# Altium footprint library MyPcb.PcbLib: 367 footprints (part 19 of 23)
Each footprint in its own frame and in the unit in brackets; x right, y up, seen from the top. Pads: shape width x height; smd on the part's side, far side on the other; paste and mask are expansions set on the pad; w line width, h text height; cw(c..) or ccw(c..) is an arc to the next point about the centre after c.
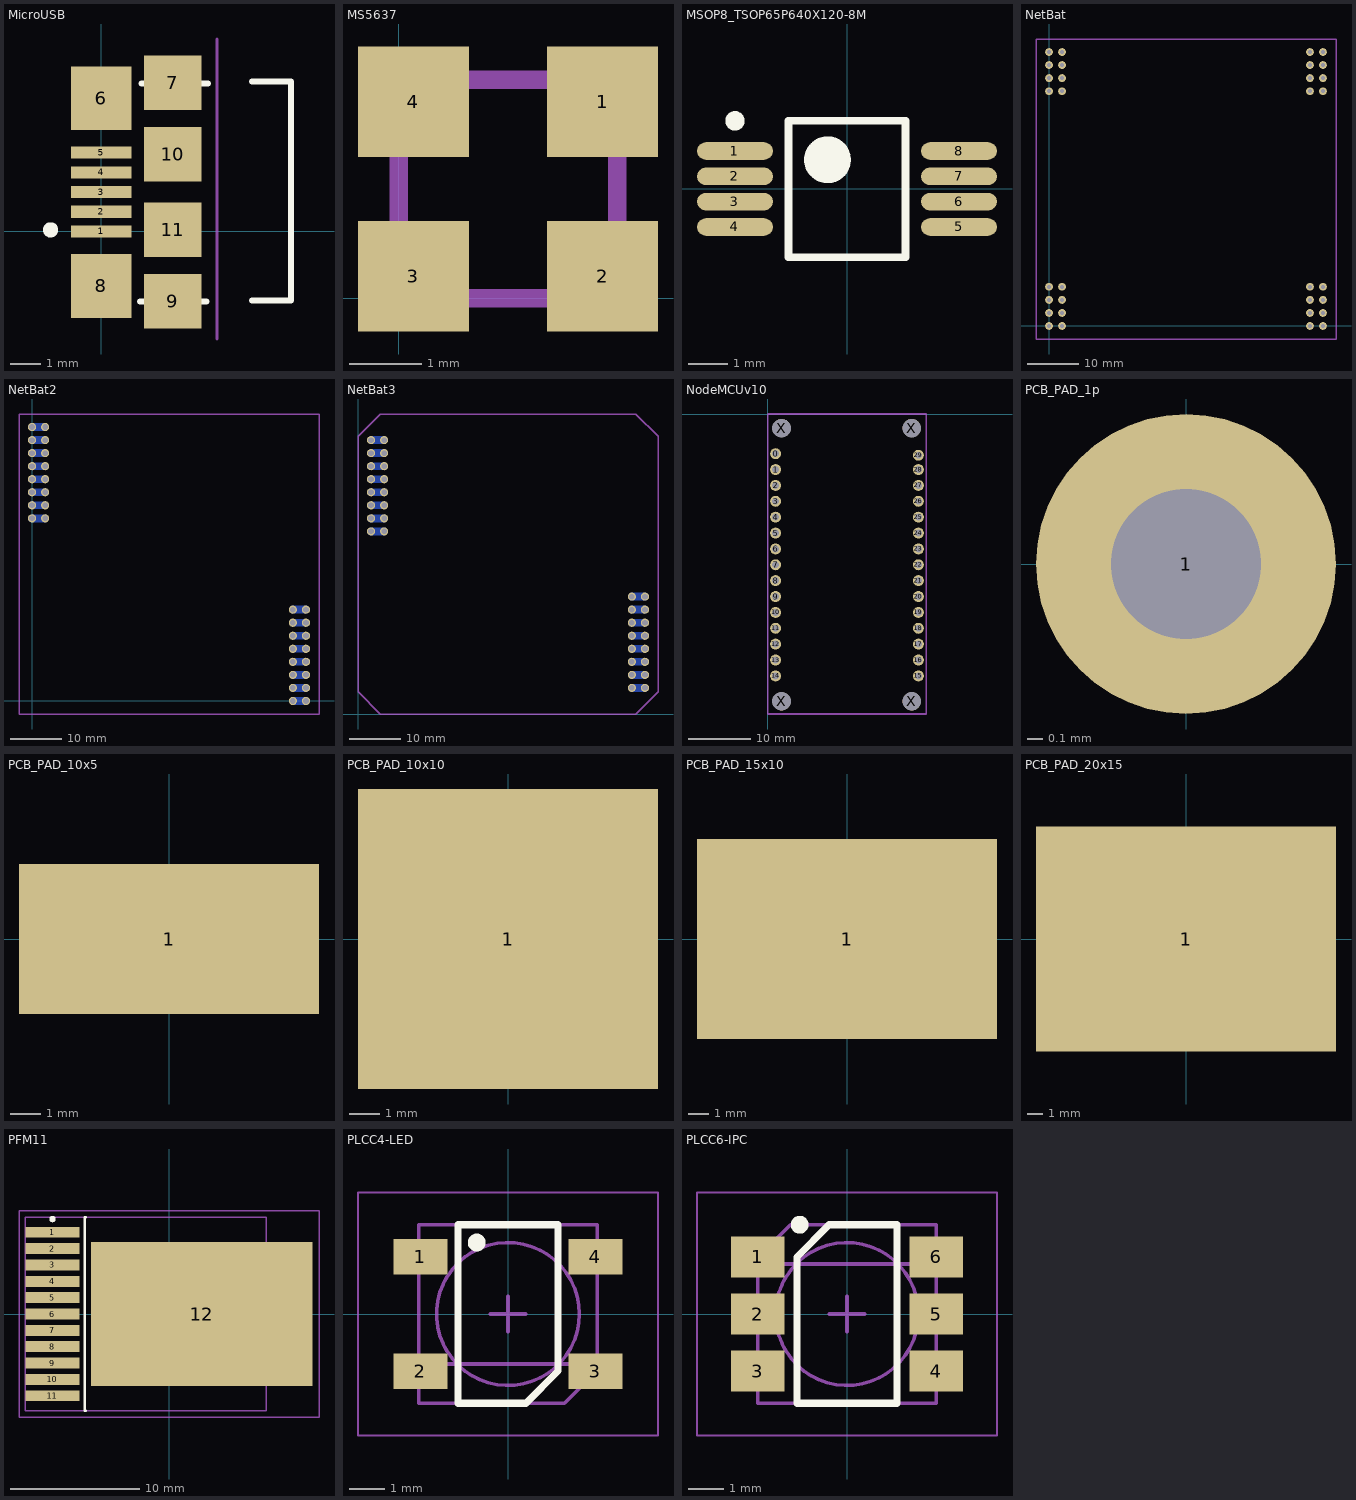
[diagram p18: the footprints below, top view; thin cyan lines are the x and y axes]

## MicroUSB [mm] "10118192-0001LF"
pads (11):
  rect 2x0.4 smd: 1(0,0) 2(0,0.65) 3(0,1.3) 4(0,1.95) 5(0,2.6)
  rect 2x2.1 smd: 6(0,4.4) 8(0,-1.8)
  rect 1.9x1.8 smd: 7(2.35,4.9) 9(2.35,-2.3) 10(2.35,2.55) 11(2.35,0.05)
Top Overlay:
  circle w0.25: c-1.676,0.051 r0.125
  lines w0.2: -0.584,-2.273 -0.584,-0.94 ; -0.584,3.696 -0.584,5.029 ; 1.27,-2.311 3.47,-2.311 ; 1.321,4.877 3.521,4.877 ; 4.963,-2.286 6.263,-2.286 6.263,4.953 4.963,4.953
Mechanical 1:
  lines w0.1: 3.81,-3.55 3.81,6.35
  text "PCB Edge" at 4.318,-2.464 h0.25

## MS5637 [mm]
pads (4):
  rect 1.524x1.524 smd: 1(2.8,2.7) 2(2.8,0.3) 3(0.2,0.3) 4(0.2,2.7)
Mechanical 1:
  lines w0.254: 0,0 3,0 3,3 0,3 0,0

## MSOP8_TSOP65P640X120-8M [mm] "TSOP, 8-Leads, Body 3,25x3,20mm, Pitch 0,65mm, IPC Low Density"
height 1.2
pads (8):
  oval 1.95x0.45 smd: 1(-2.875,0.975) 2(-2.875,0.325) 3(-2.875,-0.325) 4(-2.875,-0.975) 5(2.875,-0.975) 6(2.875,-0.325) 7(2.875,0.325) 8(2.875,0.975)
Top Overlay:
  circle w0.6: c-0.5,0.75 r0.3
  circle w0.25: c-2.875,1.75 r0.125
  lines w0.2: -1.5,-1.75 1.5,-1.75 1.5,1.75 -1.5,1.75 -1.5,-1.75

## NetBat [mil]
pads (32):
  round 60 hole 30: 3V(2100,300) 3V(2100,1800) 5V(2000,300) 5V(2000,1800) ESP_RX(0,200) ESP_RX(0,1900) ESP_TX(100,200) ESP_TX(100,1900) GND(2100,0) GND(2100,2100) MISO(2000,100) MISO(2000,2000) MOSI(2100,100) MOSI(2100,2000) NETSTATUS(100,100) NETSTATUS(100,2000) SCK(2000,200) SCK(2000,1900) SCL(100,300) SCL(100,1800) SDA(0,300) SDA(0,1800) SIM_KEY(0,0) SIM_KEY(0,2100) SS(2100,200) SS(2100,1900) STATUS(0,100) STATUS(0,2000) SZENZORLED(100,0) SZENZORLED(100,2100) UART_EN(2000,0) UART_EN(2000,2100)
Mechanical 1:
  lines w10: -100,-100 -100,2200 2200,2200 2200,-100 -100,-100
3D body: height 100, standoff 0, extent 2060,-50 2140,50
3D body: height 100, standoff 0, extent 2060,50 2140,150
3D body: height 100, standoff 0, extent 2060,150 2140,250
3D body: height 100, standoff 0, extent 2060,250 2140,350
3D body: height 100, standoff 0, extent 1960,-50 2040,50
3D body: height 100, standoff 0, extent 1960,50 2040,150
3D body: height 100, standoff 0, extent 1960,150 2040,250
3D body: height 100, standoff 0, extent 1960,250 2040,350
3D body: height 100, standoff 0, extent 2060,1750 2140,1850
3D body: height 100, standoff 0, extent 2060,1850 2140,1950
3D body: height 100, standoff 0, extent 2060,1950 2140,2050
3D body: height 100, standoff 0, extent 2060,2050 2140,2150
3D body: height 100, standoff 0, extent 1960,1750 2040,1850
3D body: height 100, standoff 0, extent 1960,1850 2040,1950
3D body: height 100, standoff 0, extent 1960,1950 2040,2050
3D body: height 100, standoff 0, extent 1960,2050 2040,2150
3D body: height 100, standoff 0, extent 60,1750 140,1850
3D body: height 100, standoff 0, extent 60,1850 140,1950
3D body: height 100, standoff 0, extent 60,1950 140,2050
3D body: height 100, standoff 0, extent 60,2050 140,2150
3D body: height 100, standoff 0, extent -40,1750 40,1850
3D body: height 100, standoff 0, extent -40,1850 40,1950
3D body: height 100, standoff 0, extent -40,1950 40,2050
3D body: height 100, standoff 0, extent -40,2050 40,2150
3D body: height 100, standoff 0, extent 60,250 140,350
3D body: height 100, standoff 0, extent 60,150 140,250
3D body: height 100, standoff 0, extent 60,50 140,150
3D body: height 100, standoff 0, extent 60,-50 140,50
3D body: height 100, standoff 0, extent -40,250 40,350
3D body: height 100, standoff 0, extent -40,150 40,250
3D body: height 100, standoff 0, extent -40,50 40,150
3D body: height 0, standoff -118.11, extent 90,-10 110,10
3D body: height 336.22, standoff 100, extent 90,-10 110,10
3D body: height 100, standoff 0, extent -40,-50 40,50
3D body: height 336.22, standoff 100, extent 90,90 110,110
3D body: height 0, standoff -118.11, extent 90,90 110,110
3D body: height 336.22, standoff 100, extent -10,90 10,110
3D body: height 0, standoff -118.11, extent -10,90 10,110
3D body: height 336.22, standoff 100, extent 90,190 110,210
3D body: height 0, standoff -118.11, extent 90,190 110,210
3D body: height 336.22, standoff 100, extent -10,190 10,210
3D body: height 0, standoff -118.11, extent -10,190 10,210
3D body: height 336.22, standoff 100, extent -10,290 10,310
3D body: height 0, standoff -118.11, extent -10,290 10,310
3D body: height 336.22, standoff 100, extent 90,290 110,310
3D body: height 0, standoff -118.11, extent 90,290 110,310
3D body: height 336.22, standoff 100, extent -10,1790 10,1810
3D body: height 0, standoff -118.11, extent -10,1790 10,1810
3D body: height 336.22, standoff 100, extent 90,1790 110,1810
3D body: height 0, standoff -118.11, extent 90,1790 110,1810
3D body: height 336.22, standoff 100, extent 90,1890 110,1910
3D body: height 0, standoff -118.11, extent 90,1890 110,1910
3D body: height 336.22, standoff 100, extent -10,1890 10,1910
3D body: height 0, standoff -118.11, extent -10,1890 10,1910
3D body: height 336.22, standoff 100, extent 90,1990 110,2010
3D body: height 0, standoff -118.11, extent 90,1990 110,2010
3D body: height 336.22, standoff 100, extent -10,1990 10,2010
3D body: height 0, standoff -118.11, extent -10,1990 10,2010
3D body: height 336.22, standoff 100, extent 90,2090 110,2110
3D body: height 0, standoff -118.11, extent 90,2090 110,2110
3D body: height 336.22, standoff 100, extent -10,2090 10,2110
3D body: height 0, standoff -118.11, extent -10,2090 10,2110
3D body: height 336.22, standoff 100, extent 1990,2090 2010,2110
3D body: height 0, standoff -118.11, extent 1990,2090 2010,2110
3D body: height 336.22, standoff 100, extent 2090,2090 2110,2110
3D body: height 0, standoff -118.11, extent 2090,2090 2110,2110
3D body: height 336.22, standoff 100, extent 2090,1990 2110,2010
3D body: height 0, standoff -118.11, extent 2090,1990 2110,2010
3D body: height 336.22, standoff 100, extent 1990,1990 2010,2010
3D body: height 0, standoff -118.11, extent 1990,1990 2010,2010
3D body: height 336.22, standoff 100, extent 2090,1890 2110,1910
3D body: height 0, standoff -118.11, extent 2090,1890 2110,1910
3D body: height 336.22, standoff 100, extent 1990,1890 2010,1910
3D body: height 0, standoff -118.11, extent 1990,1890 2010,1910
3D body: height 336.22, standoff 100, extent 2090,1790 2110,1810
3D body: height 0, standoff -118.11, extent 2090,1790 2110,1810
3D body: height 336.22, standoff 100, extent 1990,1790 2010,1810
3D body: height 0, standoff -118.11, extent 1990,1790 2010,1810
3D body: height 336.22, standoff 100, extent 1990,290 2010,310
3D body: height 0, standoff -118.11, extent 1990,290 2010,310
3D body: height 336.22, standoff 100, extent 2090,290 2110,310
3D body: height 0, standoff -118.11, extent 2090,290 2110,310
3D body: height 336.22, standoff 100, extent 1990,190 2010,210
3D body: height 0, standoff -118.11, extent 1990,190 2010,210
3D body: height 336.22, standoff 100, extent 2090,190 2110,210
3D body: height 0, standoff -118.11, extent 2090,190 2110,210
3D body: height 336.22, standoff 100, extent 2090,90 2110,110
3D body: height 0, standoff -118.11, extent 2090,90 2110,110
3D body: height 336.22, standoff 100, extent 1990,90 2010,110
3D body: height 0, standoff -118.11, extent 1990,90 2010,110
3D body: height 336.22, standoff 100, extent 1990,-10 2010,10
3D body: height 0, standoff -118.11, extent 1990,-10 2010,10
3D body: height 336.22, standoff 100, extent 2090,-10 2110,10
3D body: height 0, standoff -118.11, extent 2090,-10 2110,10
3D body: height 336.22, standoff 100, extent -10,-10 10,10
3D body: height 0, standoff -118.11, extent -10,-10 10,10

## NetBat2 [mm]
pads (32):
  round 1.6 hole 1.1: 3V(50.8,5.08) 3V(53.34,5.08) 5V(50.8,2.54) 5V(53.34,2.54) ESP_RX(50.8,15.24) ESP_RX(53.34,15.24) ESP_TX(50.8,17.78) ESP_TX(53.34,17.78) GND(50.8,0) GND(53.34,0) MISO(0,48.26) MISO(2.54,48.26) MOSI(0,45.72) MOSI(2.54,45.72) NETSTATUS(0,40.64) NETSTATUS(2.54,40.64) SCK(0,50.8) SCK(2.54,50.8) SCL(50.8,12.7) SCL(53.34,12.7) SDA(50.8,10.16) SDA(53.34,10.16) SIM_KEY(0,38.1) SIM_KEY(2.54,38.1) SS(0,53.34) SS(2.54,53.34) STATUS(0,43.18) STATUS(2.54,43.18) SZENZORLED(0,35.56) SZENZORLED(2.54,35.56) UART_EN(50.8,7.62) UART_EN(53.34,7.62)
Bottom Layer:
  lines w1.524: 0,35.56 2.54,35.56 ; 0,38.1 2.54,38.1 ; 0,40.64 2.54,40.64 ; 0,43.18 2.54,43.18 ; 0,45.72 2.54,45.72 ; 0,48.26 2.54,48.26 ; 0,50.8 2.54,50.8 ; 0,53.34 2.54,53.34 ; 50.8,0 53.34,0 ; 50.8,2.54 53.34,2.54 ; 50.8,5.08 53.34,5.08 ; 50.8,7.62 53.34,7.62 ; 50.8,10.16 53.34,10.16 ; 50.8,12.7 53.34,12.7 ; 50.8,15.24 53.34,15.24 ; 50.8,17.78 53.34,17.78
Mechanical 1:
  lines w0.254: -2.54,-2.54 -2.54,55.88 55.88,55.88 55.88,-2.54 -2.54,-2.54
3D body: height 2.54, standoff 0, extent 52.324,-1.27 54.356,1.27
3D body: height 2.54, standoff 0, extent 52.324,1.27 54.356,3.81
3D body: height 2.54, standoff 0, extent 52.324,3.81 54.356,6.35
3D body: height 2.54, standoff 0, extent 52.324,6.35 54.356,8.89
3D body: height 2.54, standoff 0, extent 49.784,-1.27 51.816,1.27
3D body: height 2.54, standoff 0, extent 49.784,1.27 51.816,3.81
3D body: height 2.54, standoff 0, extent 49.784,3.81 51.816,6.35
3D body: height 2.54, standoff 0, extent 49.784,6.35 51.816,8.89
3D body: height 8.54, standoff 2.54, extent 50.546,7.366 51.054,7.874
3D body: height 0, standoff -3, extent 50.546,7.366 51.054,7.874
3D body: height 8.54, standoff 2.54, extent 53.086,7.366 53.594,7.874
3D body: height 0, standoff -3, extent 53.086,7.366 53.594,7.874
3D body: height 8.54, standoff 2.54, extent 50.546,4.826 51.054,5.334
3D body: height 0, standoff -3, extent 50.546,4.826 51.054,5.334
3D body: height 8.54, standoff 2.54, extent 53.086,4.826 53.594,5.334
3D body: height 0, standoff -3, extent 53.086,4.826 53.594,5.334
3D body: height 8.54, standoff 2.54, extent 53.086,2.286 53.594,2.794
3D body: height 0, standoff -3, extent 53.086,2.286 53.594,2.794
3D body: height 8.54, standoff 2.54, extent 50.546,2.286 51.054,2.794
3D body: height 0, standoff -3, extent 50.546,2.286 51.054,2.794
3D body: height 8.54, standoff 2.54, extent 50.546,-0.254 51.054,0.254
3D body: height 0, standoff -3, extent 50.546,-0.254 51.054,0.254
3D body: height 8.54, standoff 2.54, extent 53.086,-0.254 53.594,0.254
3D body: height 0, standoff -3, extent 53.086,-0.254 53.594,0.254
3D body: height 0, standoff -3, extent 53.086,9.906 53.594,10.414
3D body: height 8.54, standoff 2.54, extent 53.086,9.906 53.594,10.414
3D body: height 0, standoff -3, extent 53.086,12.446 53.594,12.954
3D body: height 8.54, standoff 2.54, extent 53.086,12.446 53.594,12.954
3D body: height 0, standoff -3, extent 53.086,14.986 53.594,15.494
3D body: height 8.54, standoff 2.54, extent 53.086,14.986 53.594,15.494
3D body: height 0, standoff -3, extent 53.086,17.526 53.594,18.034
3D body: height 8.54, standoff 2.54, extent 53.086,17.526 53.594,18.034
3D body: height 2.54, standoff 0, extent 52.324,16.51 54.356,19.05
3D body: height 2.54, standoff 0, extent 52.324,13.97 54.356,16.51
3D body: height 2.54, standoff 0, extent 52.324,11.43 54.356,13.97
3D body: height 2.54, standoff 0, extent 52.324,8.89 54.356,11.43
3D body: height 0, standoff -3, extent 50.546,9.906 51.054,10.414
3D body: height 8.54, standoff 2.54, extent 50.546,9.906 51.054,10.414
3D body: height 0, standoff -3, extent 50.546,12.446 51.054,12.954
3D body: height 8.54, standoff 2.54, extent 50.546,12.446 51.054,12.954
3D body: height 0, standoff -3, extent 50.546,14.986 51.054,15.494
3D body: height 8.54, standoff 2.54, extent 50.546,14.986 51.054,15.494
3D body: height 0, standoff -3, extent 50.546,17.526 51.054,18.034
3D body: height 8.54, standoff 2.54, extent 50.546,17.526 51.054,18.034
3D body: height 2.54, standoff 0, extent 49.784,16.51 51.816,19.05
3D body: height 2.54, standoff 0, extent 49.784,13.97 51.816,16.51
3D body: height 2.54, standoff 0, extent 49.784,11.43 51.816,13.97
3D body: height 2.54, standoff 0, extent 49.784,8.89 51.816,11.43
3D body: height 2.54, standoff 0, extent -1.016,44.45 1.016,46.99
3D body: height 2.54, standoff 0, extent -1.016,46.99 1.016,49.53
3D body: height 2.54, standoff 0, extent -1.016,49.53 1.016,52.07
3D body: height 2.54, standoff 0, extent -1.016,52.07 1.016,54.61
3D body: height 8.54, standoff 2.54, extent -0.254,45.466 0.254,45.974
3D body: height 0, standoff -3, extent -0.254,45.466 0.254,45.974
3D body: height 8.54, standoff 2.54, extent -0.254,48.006 0.254,48.514
3D body: height 0, standoff -3, extent -0.254,48.006 0.254,48.514
3D body: height 8.54, standoff 2.54, extent -0.254,50.546 0.254,51.054
3D body: height 0, standoff -3, extent -0.254,50.546 0.254,51.054
3D body: height 8.54, standoff 2.54, extent -0.254,53.086 0.254,53.594
3D body: height 0, standoff -3, extent -0.254,53.086 0.254,53.594
3D body: height 0, standoff -3, extent -0.254,42.926 0.254,43.434
3D body: height 8.54, standoff 2.54, extent -0.254,42.926 0.254,43.434
3D body: height 0, standoff -3, extent -0.254,40.386 0.254,40.894
3D body: height 8.54, standoff 2.54, extent -0.254,40.386 0.254,40.894
3D body: height 0, standoff -3, extent -0.254,37.846 0.254,38.354
3D body: height 8.54, standoff 2.54, extent -0.254,37.846 0.254,38.354
3D body: height 2.54, standoff 0, extent -1.016,36.83 1.016,39.37
3D body: height 2.54, standoff 0, extent -1.016,39.37 1.016,41.91
3D body: height 2.54, standoff 0, extent -1.016,41.91 1.016,44.45
3D body: height 2.54, standoff 0, extent 1.524,44.45 3.556,46.99
3D body: height 2.54, standoff 0, extent 1.524,46.99 3.556,49.53
3D body: height 2.54, standoff 0, extent 1.524,49.53 3.556,52.07
3D body: height 2.54, standoff 0, extent 1.524,52.07 3.556,54.61
3D body: height 8.54, standoff 2.54, extent 2.286,45.466 2.794,45.974
3D body: height 0, standoff -3, extent 2.286,45.466 2.794,45.974
3D body: height 8.54, standoff 2.54, extent 2.286,48.006 2.794,48.514
3D body: height 0, standoff -3, extent 2.286,48.006 2.794,48.514
3D body: height 8.54, standoff 2.54, extent 2.286,50.546 2.794,51.054
3D body: height 0, standoff -3, extent 2.286,50.546 2.794,51.054
3D body: height 8.54, standoff 2.54, extent 2.286,53.086 2.794,53.594
3D body: height 0, standoff -3, extent 2.286,53.086 2.794,53.594
3D body: height 0, standoff -3, extent 2.286,35.306 2.794,35.814
3D body: height 8.54, standoff 2.54, extent 2.286,35.306 2.794,35.814
3D body: height 0, standoff -3, extent 2.286,42.926 2.794,43.434
3D body: height 8.54, standoff 2.54, extent 2.286,42.926 2.794,43.434
3D body: height 0, standoff -3, extent 2.286,40.386 2.794,40.894
3D body: height 8.54, standoff 2.54, extent 2.286,40.386 2.794,40.894
3D body: height 0, standoff -3, extent 2.286,37.846 2.794,38.354
3D body: height 8.54, standoff 2.54, extent 2.286,37.846 2.794,38.354
3D body: height 2.54, standoff 0, extent 1.524,34.29 3.556,36.83
3D body: height 2.54, standoff 0, extent 1.524,36.83 3.556,39.37
3D body: height 2.54, standoff 0, extent 1.524,39.37 3.556,41.91
3D body: height 2.54, standoff 0, extent 1.524,41.91 3.556,44.45
3D body: height 2.54, standoff 0, extent -1.016,34.29 1.016,36.83
3D body: height 8.54, standoff 2.54, extent -0.254,35.306 0.254,35.814
3D body: height 0, standoff -3, extent -0.254,35.306 0.254,35.814

## NetBat3 [mm]
pads (32):
  round 1.6 hole 1.1: 3V(53.34,10.16) 3V(55.88,10.16) 5V(53.34,7.62) 5V(55.88,7.62) ESP_RX(53.34,20.32) ESP_RX(55.88,20.32) ESP_TX(53.34,22.86) ESP_TX(55.88,22.86) GND(53.34,5.08) GND(55.88,5.08) MISO(2.54,48.26) MISO(5.08,48.26) MOSI(2.54,45.72) MOSI(5.08,45.72) NETSTATUS(2.54,40.64) NETSTATUS(5.08,40.64) SCK(2.54,50.8) SCK(5.08,50.8) SCL(53.34,17.78) SCL(55.88,17.78) SDA(53.34,15.24) SDA(55.88,15.24) SIM_KEY(2.54,38.1) SIM_KEY(5.08,38.1) SS(2.54,53.34) SS(5.08,53.34) STATUS(2.54,43.18) STATUS(5.08,43.18) SZENZORLED(2.54,35.56) SZENZORLED(5.08,35.56) UART_EN(53.34,12.7) UART_EN(55.88,12.7)
Bottom Layer:
  lines w1.524: 2.54,35.56 5.08,35.56 ; 2.54,38.1 5.08,38.1 ; 2.54,40.64 5.08,40.64 ; 2.54,43.18 5.08,43.18 ; 2.54,45.72 5.08,45.72 ; 2.54,48.26 5.08,48.26 ; 2.54,50.8 5.08,50.8 ; 2.54,53.34 5.08,53.34 ; 53.34,5.08 55.88,5.08 ; 53.34,7.62 55.88,7.62 ; 53.34,10.16 55.88,10.16 ; 53.34,12.7 55.88,12.7 ; 53.34,15.24 55.88,15.24 ; 53.34,17.78 55.88,17.78 ; 53.34,20.32 55.88,20.32 ; 53.34,22.86 55.88,22.86
Mechanical 1:
  lines w0.254: 0,4.318 0,54.102 4.318,58.42 54.102,58.42 58.42,54.102 58.42,4.318 54.102,0 4.318,0 0,4.318
3D body: height 2.54, standoff 0, extent 54.864,3.81 56.896,6.35
3D body: height 2.54, standoff 0, extent 54.864,6.35 56.896,8.89
3D body: height 2.54, standoff 0, extent 54.864,8.89 56.896,11.43
3D body: height 2.54, standoff 0, extent 54.864,11.43 56.896,13.97
3D body: height 2.54, standoff 0, extent 52.324,3.81 54.356,6.35
3D body: height 2.54, standoff 0, extent 52.324,6.35 54.356,8.89
3D body: height 2.54, standoff 0, extent 52.324,8.89 54.356,11.43
3D body: height 2.54, standoff 0, extent 52.324,11.43 54.356,13.97
3D body: height 8.54, standoff 2.54, extent 53.086,12.446 53.594,12.954
3D body: height 0, standoff -3, extent 53.086,12.446 53.594,12.954
3D body: height 8.54, standoff 2.54, extent 55.626,12.446 56.134,12.954
3D body: height 0, standoff -3, extent 55.626,12.446 56.134,12.954
3D body: height 8.54, standoff 2.54, extent 53.086,9.906 53.594,10.414
3D body: height 0, standoff -3, extent 53.086,9.906 53.594,10.414
3D body: height 8.54, standoff 2.54, extent 55.626,9.906 56.134,10.414
3D body: height 0, standoff -3, extent 55.626,9.906 56.134,10.414
3D body: height 8.54, standoff 2.54, extent 55.626,7.366 56.134,7.874
3D body: height 0, standoff -3, extent 55.626,7.366 56.134,7.874
3D body: height 8.54, standoff 2.54, extent 53.086,7.366 53.594,7.874
3D body: height 0, standoff -3, extent 53.086,7.366 53.594,7.874
3D body: height 8.54, standoff 2.54, extent 53.086,4.826 53.594,5.334
3D body: height 0, standoff -3, extent 53.086,4.826 53.594,5.334
3D body: height 8.54, standoff 2.54, extent 55.626,4.826 56.134,5.334
3D body: height 0, standoff -3, extent 55.626,4.826 56.134,5.334
3D body: height 0, standoff -3, extent 55.626,14.986 56.134,15.494
3D body: height 8.54, standoff 2.54, extent 55.626,14.986 56.134,15.494
3D body: height 0, standoff -3, extent 55.626,17.526 56.134,18.034
3D body: height 8.54, standoff 2.54, extent 55.626,17.526 56.134,18.034
3D body: height 0, standoff -3, extent 55.626,20.066 56.134,20.574
3D body: height 8.54, standoff 2.54, extent 55.626,20.066 56.134,20.574
3D body: height 0, standoff -3, extent 55.626,22.606 56.134,23.114
3D body: height 8.54, standoff 2.54, extent 55.626,22.606 56.134,23.114
3D body: height 2.54, standoff 0, extent 54.864,21.59 56.896,24.13
3D body: height 2.54, standoff 0, extent 54.864,19.05 56.896,21.59
3D body: height 2.54, standoff 0, extent 54.864,16.51 56.896,19.05
3D body: height 2.54, standoff 0, extent 54.864,13.97 56.896,16.51
3D body: height 0, standoff -3, extent 53.086,14.986 53.594,15.494
3D body: height 8.54, standoff 2.54, extent 53.086,14.986 53.594,15.494
3D body: height 0, standoff -3, extent 53.086,17.526 53.594,18.034
3D body: height 8.54, standoff 2.54, extent 53.086,17.526 53.594,18.034
3D body: height 0, standoff -3, extent 53.086,20.066 53.594,20.574
3D body: height 8.54, standoff 2.54, extent 53.086,20.066 53.594,20.574
3D body: height 0, standoff -3, extent 53.086,22.606 53.594,23.114
3D body: height 8.54, standoff 2.54, extent 53.086,22.606 53.594,23.114
3D body: height 2.54, standoff 0, extent 52.324,21.59 54.356,24.13
3D body: height 2.54, standoff 0, extent 52.324,19.05 54.356,21.59
3D body: height 2.54, standoff 0, extent 52.324,16.51 54.356,19.05
3D body: height 2.54, standoff 0, extent 52.324,13.97 54.356,16.51
3D body: height 2.54, standoff 0, extent 1.524,44.45 3.556,46.99
3D body: height 2.54, standoff 0, extent 1.524,46.99 3.556,49.53
3D body: height 2.54, standoff 0, extent 1.524,49.53 3.556,52.07
3D body: height 2.54, standoff 0, extent 1.524,52.07 3.556,54.61
3D body: height 8.54, standoff 2.54, extent 2.286,45.466 2.794,45.974
3D body: height 0, standoff -3, extent 2.286,45.466 2.794,45.974
3D body: height 8.54, standoff 2.54, extent 2.286,48.006 2.794,48.514
3D body: height 0, standoff -3, extent 2.286,48.006 2.794,48.514
3D body: height 8.54, standoff 2.54, extent 2.286,50.546 2.794,51.054
3D body: height 0, standoff -3, extent 2.286,50.546 2.794,51.054
3D body: height 8.54, standoff 2.54, extent 2.286,53.086 2.794,53.594
3D body: height 0, standoff -3, extent 2.286,53.086 2.794,53.594
3D body: height 0, standoff -3, extent 2.286,42.926 2.794,43.434
3D body: height 8.54, standoff 2.54, extent 2.286,42.926 2.794,43.434
3D body: height 0, standoff -3, extent 2.286,40.386 2.794,40.894
3D body: height 8.54, standoff 2.54, extent 2.286,40.386 2.794,40.894
3D body: height 0, standoff -3, extent 2.286,37.846 2.794,38.354
3D body: height 8.54, standoff 2.54, extent 2.286,37.846 2.794,38.354
3D body: height 2.54, standoff 0, extent 1.524,36.83 3.556,39.37
3D body: height 2.54, standoff 0, extent 1.524,39.37 3.556,41.91
3D body: height 2.54, standoff 0, extent 1.524,41.91 3.556,44.45
3D body: height 2.54, standoff 0, extent 4.064,44.45 6.096,46.99
3D body: height 2.54, standoff 0, extent 4.064,46.99 6.096,49.53
3D body: height 2.54, standoff 0, extent 4.064,49.53 6.096,52.07
3D body: height 2.54, standoff 0, extent 4.064,52.07 6.096,54.61
3D body: height 8.54, standoff 2.54, extent 4.826,45.466 5.334,45.974
3D body: height 0, standoff -3, extent 4.826,45.466 5.334,45.974
3D body: height 8.54, standoff 2.54, extent 4.826,48.006 5.334,48.514
3D body: height 0, standoff -3, extent 4.826,48.006 5.334,48.514
3D body: height 8.54, standoff 2.54, extent 4.826,50.546 5.334,51.054
3D body: height 0, standoff -3, extent 4.826,50.546 5.334,51.054
3D body: height 8.54, standoff 2.54, extent 4.826,53.086 5.334,53.594
3D body: height 0, standoff -3, extent 4.826,53.086 5.334,53.594
3D body: height 0, standoff -3, extent 4.826,35.306 5.334,35.814
3D body: height 8.54, standoff 2.54, extent 4.826,35.306 5.334,35.814
3D body: height 0, standoff -3, extent 4.826,42.926 5.334,43.434
3D body: height 8.54, standoff 2.54, extent 4.826,42.926 5.334,43.434
3D body: height 0, standoff -3, extent 4.826,40.386 5.334,40.894
3D body: height 8.54, standoff 2.54, extent 4.826,40.386 5.334,40.894
3D body: height 0, standoff -3, extent 4.826,37.846 5.334,38.354
3D body: height 8.54, standoff 2.54, extent 4.826,37.846 5.334,38.354
3D body: height 2.54, standoff 0, extent 4.064,34.29 6.096,36.83
3D body: height 2.54, standoff 0, extent 4.064,36.83 6.096,39.37
3D body: height 2.54, standoff 0, extent 4.064,39.37 6.096,41.91
3D body: height 2.54, standoff 0, extent 4.064,41.91 6.096,44.45
3D body: height 2.54, standoff 0, extent 1.524,34.29 3.556,36.83
3D body: height 8.54, standoff 2.54, extent 2.286,35.306 2.794,35.814
3D body: height 0, standoff -3, extent 2.286,35.306 2.794,35.814

## NodeMCUv10 [mm]
pads (34):
  round 1.75 hole 1.1: 0(1.27,-6.35) 1(1.27,-8.89) 2(1.27,-11.43) 3(1.27,-13.97) 4(1.27,-16.51) 5(1.27,-19.05) 6(1.27,-21.59) 7(1.27,-24.13) 8(1.27,-26.67) 9(1.27,-29.21) 10(1.27,-31.75) 11(1.27,-34.29) 12(1.27,-36.83) 13(1.27,-39.37) 14(1.27,-41.91) 15(24.13,-41.91) 16(24.13,-39.37) 17(24.13,-36.83) 18(24.13,-34.29) 19(24.13,-31.75) 20(24.13,-29.21) 21(24.13,-26.67) 22(24.13,-24.13) 23(24.13,-21.59) 24(24.13,-19.05) 25(24.13,-16.51) 26(24.13,-13.97) 27(24.13,-11.43) 28(24.13,-8.89) 29(24.13,-6.604)
  round 2.921 hole 3 unplated paste-7.62 mask-7.62: X(2.235,-45.974) X(2.235,-2.268) X(23.063,-45.974) X(23.063,-2.268)
Mechanical 1:
  lines w0.254: 1.27,-6.858 1.27,-6.35 ; 0,-48.006 0,0 25.4,0 25.4,-48.006 0,-48.006

## PCB_PAD_1p [mm]
pads (1):
  round 2 hole 1: 1(0,0)

## PCB_PAD_10x5 [mm]
height 4
pads (1):
  rect 10x5 smd: 1(0,0)

## PCB_PAD_10x10 [mm]
height 4
pads (1):
  rect 10x10 smd: 1(0,0)

## PCB_PAD_15x10 [mm]
height 4
pads (1):
  rect 15x10 smd: 1(0,0)

## PCB_PAD_20x15 [mm]
height 4
pads (1):
  rect 20x15 smd: 1(0,0)

## PCBComponent_1 - duplicate [mm]

## PFM11 [mm] "PFM11"
height 6
pads (12):
  rect 4.2x0.85 smd: 1(-9.05,6.35) 2(-9.05,5.08) 3(-9.05,3.81) 4(-9.05,2.54) 5(-9.05,1.27) 6(-9.05,0) 7(-9.05,-1.27) 8(-9.05,-2.54) 9(-9.05,-3.81) 10(-9.05,-5.08) 11(-9.05,-6.35)
  rect 17.2x11.15 smd: 12(2.55,0)
Top Overlay:
  circle w0.25: c-9.05,7.375 r0.125
  lines w0.2: -6.45,-7.5 -6.55,-7.5 -6.55,7.5 -6.45,7.5
Mechanical 13:
  lines w0.1: -11.15,-7.5 -11.15,7.5 7.55,7.5 7.55,-7.5 -11.15,-7.5
Mechanical 15:
  lines w0.1: -0.5,0 0.5,0 ; 0,-0.5 0,0.5 ; -11.65,-8 -11.65,8 11.65,8 11.65,-8 -11.65,-8
3D body: height 6, standoff 0, extent -11.15,-7.5 7.55,7.5

## PLCC4-LED [mm] "For WS2812B"
height 1.6
pads (4):
  rect 1.5x1 smd: 1(-2.45,1.6) 2(-2.45,-1.6) 3(2.45,-1.6) 4(2.45,1.6)
Top Overlay:
  circle w0.25: c-0.875,2 r0.125
  lines w0.2: -1.4,-2.5 -1.4,2.5 1.4,2.5 1.4,-1.6 0.5,-2.5 -1.4,-2.5
Mechanical 13:
  circle w0.1: c0,0 r2
  lines w0.1: -2.5,-1.4 2.5,-1.4 ; -2.5,-2.5 -2.5,2.5 2.5,2.5 2.5,-1.58 1.58,-2.5 -2.5,-2.5
Mechanical 15:
  lines w0.05: -4.2,-3.4 4.2,-3.4 4.2,3.4 -4.2,3.4 -4.2,-3.4
  lines w0.1: -0.5,0 0.5,0 ; 0,-0.5 0,0.5
3D body: height 1.6, standoff 1.4, extent -2.5,-2.5 2.5,2.5
3D body: height 1.61, standoff 1.3, extent -2,-1.996 1.984,1.996
3D body: height 1.4, standoff 0.1, extent -2.5,-2.5 2.5,2.5

## PLCC6-IPC [mm]
pads (6):
  rect 1.5x1.15 smd: 1(-2.5,1.6) 2(-2.5,0) 3(-2.5,-1.6) 4(2.5,-1.6) 5(2.5,0) 6(2.5,1.6)
Top Overlay:
  circle w0.25: c-1.325,2.5 r0.125
  lines w0.2: -1.4,-2.5 1.4,-2.5 1.4,2.5 -0.5,2.5 -1.4,1.6 -1.4,-2.5
Mechanical 13:
  circle w0.1: c0,0 r2
  lines w0.1: -2.5,1.4 2.5,1.4 ; -2.5,-2.5 -2.5,1.58 -1.58,2.5 2.5,2.5 2.5,-2.5 -2.5,-2.5
Mechanical 15:
  lines w0.05: -4.2,-3.4 -4.2,3.4 4.2,3.4 4.2,-3.4 -4.2,-3.4
  lines w0.1: -0.5,0 0.5,0 ; 0,-0.5 0,0.5
3D body: height 1.4, standoff 0.1, extent -2.5,-2.5 2.5,2.5
3D body: height 1.61, standoff 1.3, extent -1.984,-1.996 2,1.996
3D body: height 1.6, standoff 1.4, extent -2.5,-2.5 2.5,2.5